# Altium footprint library KF.PcbLib: 43 footprints (part 3 of 3)
Each footprint in its own frame and in the unit in brackets; x right, y up, seen from the top. Pads: shape width x height; smd on the part's side, far side on the other; paste and mask are expansions set on the pad; w line width, h text height; cw(c..) or ccw(c..) is an arc to the next point about the centre after c.
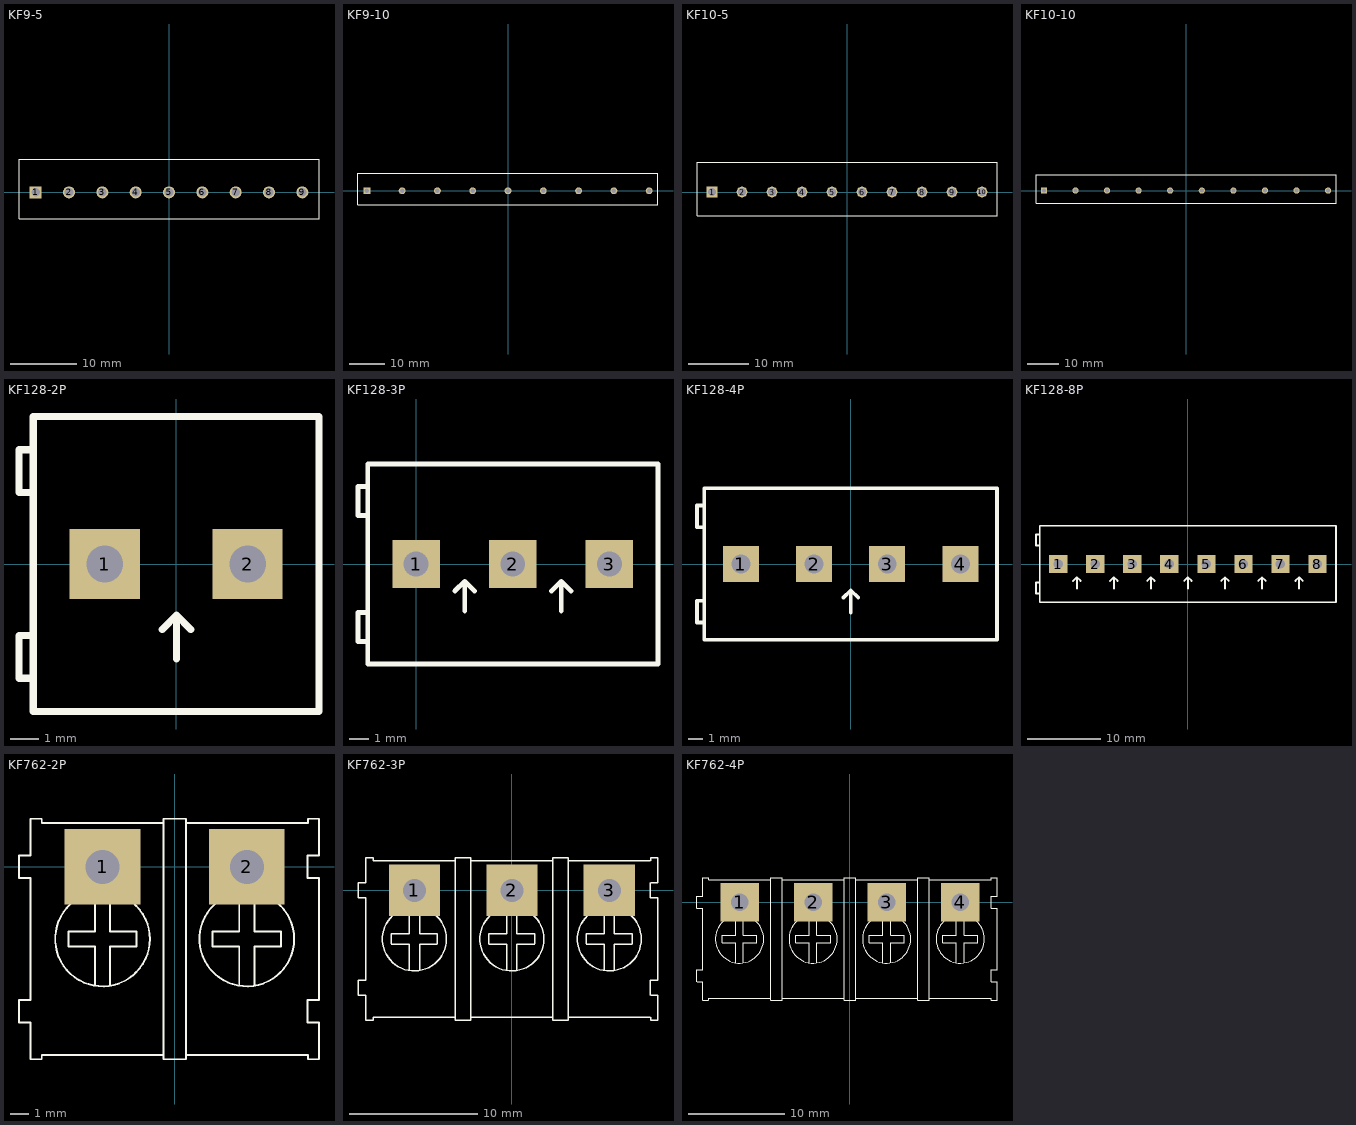
[diagram p2: the footprints below, top view; thin cyan lines are the x and y axes]

## KF9-5 [mm] "Serie 1337 - 5.00 mm_9 pins"
height 13
pads (9):
  rect 1.8x1.8 hole 1.3: 1(-20,0)
  round 1.8 hole 1.3: 2(-15,0) 3(-10,0) 4(-5,0) 5(0,0) 6(5,0) 7(10,0) 8(15,0) 9(20,0)
Top Overlay:
  lines w0.127: -22.5,-4 22.5,-4 22.5,5 -22.5,5 -22.5,-4
3D body "691133710009.stp": height 13, standoff -3.6, extent -22.5,-4 22.5,5

## KF9-10 [mm] "Serie 1368 - 10.00 mm _ 9 pins"
height 13
pads (9):
  rect 1.95x1.95 hole 1.3: 1(-40,0)
  round 1.95 hole 1.3: 2(-30,0) 3(-20,0) 4(-10,0) 5(0,0) 6(10,0) 7(20,0) 8(30,0) 9(40,0)
Top Overlay:
  lines w0.2: -42.5,-4 42.5,-4 42.5,5 -42.5,5 -42.5,-4
3D body "691136810009.stp": height 13.1, standoff -3.9, extent -42.5,-4 42.5,5

## KF10-5 [mm] "Serie 1337 - 5.00 mm_10 pins"
height 13
pads (10):
  rect 1.8x1.8 hole 1.3: 1(-22.5,0)
  round 1.8 hole 1.3: 2(-17.5,0) 3(-12.5,0) 4(-7.5,0) 5(-2.5,0) 6(2.5,0) 7(7.5,0) 8(12.5,0) 9(17.5,0) 10(22.5,0)
Top Overlay:
  lines w0.127: -25,-4 25,-4 25,5 -25,5 -25,-4
3D body "691133710010.stp": height 13, standoff -3.6, extent -25,-4 25,5

## KF10-10 [mm] "Serie 1368 - 10.00 mm _ 10 pins"
height 13
pads (10):
  rect 1.95x1.95 hole 1.3: 1(-45,0)
  round 1.95 hole 1.3: 2(-35,0) 3(-25,0) 4(-15,0) 5(-5,0) 6(5,0) 7(15,0) 8(25,0) 9(35,0) 10(45,0)
Top Overlay:
  lines w0.2: -47.5,-4 -47.5,5 47.5,5 47.5,-4 -47.5,-4
3D body "691136810010.stp": height 13.1, standoff -3.9, extent -47.5,-4 47.5,5

## KF128-2P [mm]
pads (2):
  rect 2.5x2.5 hole 1.3: 1(-2.54,0) 2(2.54,0)
Top Overlay:
  lines w0.254: -0.495,-2.324 0.013,-1.816 ; 0.013,-3.378 0.013,-1.816 ; 0.521,-2.324 0.013,-1.816 ; -5.588,-4.064 -5.08,-4.064 -5.08,-2.54 -5.588,-2.54 -5.588,-4.064 ; -5.588,2.54 -5.08,2.54 -5.08,4.064 -5.588,4.064 -5.588,2.54 ; -5.08,-5.25 5.08,-5.25 5.08,5.25 -5.08,5.25 -5.08,-5.25
3D body "User Library-TER-KF128-2P.step": height 14.35, standoff -4.95, extent -5.68,-5.25 5.08,5.25

## KF128-3P [mm]
pads (3):
  rect 2.5x2.5 hole 1.3: 1(0,0) 2(5.08,0) 3(10.147,0)
Top Overlay:
  lines w0.254: 2.045,-1.41 2.553,-0.902 ; 2.553,-2.464 2.553,-0.902 ; 3.061,-1.41 2.553,-0.902 ; 7.112,-1.41 7.62,-0.902 ; 7.62,-2.464 7.62,-0.902 ; 8.128,-1.41 7.62,-0.902 ; -3.048,-4.064 -2.54,-4.064 -2.54,-2.54 -3.048,-2.54 -3.048,-4.064 ; -3.048,2.54 -3.048,4.064 -2.54,4.064 -2.54,2.54 -3.048,2.54 ; -2.54,-5.25 -2.54,5.25 12.7,5.25 12.7,-5.25 -2.54,-5.25
3D body "User Library-TER-KF128-3P.step": height 14.55, standoff -4.75, extent -3.152,-5.253 12.688,5.247

## KF128-4P [mm]
pads (4):
  rect 2.5x2.5 hole 1.3: 1(-7.62,0) 2(-2.54,0) 3(2.54,0) 4(7.62,0)
Top Overlay:
  lines w0.254: -0.495,-2.324 0.013,-1.816 ; 0.013,-3.378 0.013,-1.816 ; 0.521,-2.324 0.013,-1.816 ; -10.668,-4.064 -10.16,-4.064 -10.16,-2.54 -10.668,-2.54 -10.668,-4.064 ; -10.668,2.54 -10.16,2.54 -10.16,4.064 -10.668,4.064 -10.668,2.54 ; -10.16,-5.25 10.16,-5.25 10.16,5.25 -10.16,5.25 -10.16,-5.25
3D body "User Library-TER-KF128-2P.step": height 14.35, standoff -4.95, extent -10.76,-5.25 0,5.25
3D body "User Library-TER-KF128-2P.step": height 14.35, standoff -4.95, extent -0.6,-5.25 10.16,5.25

## KF128-8P [mm]
pads (8):
  rect 2.5x2.5 hole 1.3: 1(-17.78,0) 2(-12.7,0) 3(-7.62,0) 4(-2.54,0) 5(2.54,0) 6(7.62,0) 7(12.7,0) 8(17.78,0)
Top Overlay:
  lines w0.254: -15.735,-2.324 -15.227,-1.816 ; -15.227,-3.378 -15.227,-1.816 ; -14.719,-2.324 -15.227,-1.816 ; -10.655,-2.324 -10.147,-1.816 ; -10.147,-3.378 -10.147,-1.816 ; -9.639,-2.324 -10.147,-1.816 ; -5.575,-2.324 -5.067,-1.816 ; -5.067,-3.378 -5.067,-1.816 ; -4.559,-2.324 -5.067,-1.816 ; -0.495,-2.324 0.013,-1.816 ; 0.013,-3.378 0.013,-1.816 ; 0.521,-2.324 0.013,-1.816 ; 4.585,-2.324 5.093,-1.816 ; 5.093,-3.378 5.093,-1.816 ; 5.601,-2.324 5.093,-1.816 ; 9.665,-2.324 10.173,-1.816 ; 10.173,-3.378 10.173,-1.816 ; 10.681,-2.324 10.173,-1.816 ; 14.745,-2.324 15.253,-1.816 ; 15.253,-3.378 15.253,-1.816 ; 15.761,-2.324 15.253,-1.816 ; -20.828,-4.064 -20.828,-2.54 -20.32,-2.54 -20.32,-4.064 -20.828,-4.064 ; -20.828,2.54 -20.828,4.064 -20.32,4.064 -20.32,2.54 -20.828,2.54 ; -20.32,-5.25 -20.32,5.25 20.32,5.25 20.32,-5.25 -20.32,-5.25
3D body "User Library-TER-KF128-2P.step": height 14.35, standoff -4.95, extent -10.76,-5.25 0,5.25
3D body "User Library-TER-KF128-2P.step": height 14.35, standoff -4.95, extent -20.92,-5.25 -10.16,5.25
3D body "User Library-TER-KF128-2P.step": height 14.35, standoff -4.95, extent -0.6,-5.25 10.16,5.25
3D body "User Library-TER-KF128-2P.step": height 14.35, standoff -4.95, extent 9.56,-5.25 20.32,5.25

## KF762-2P [mm]
pads (2):
  rect 4x4 hole 1.8: 1(-3.81,0) 2(3.81,0)
Top Overlay:
  circle w0.102: c-3.81,-3.81 r2.5
  circle w0.102: c3.81,-3.81 r2.5
  lines w0.102: -8.22,-8.22 -8.22,-7.02 -7.62,-7.02 -7.62,-0.6 -8.22,-0.6 -8.22,0.6 ; -8.204,-8.22 -7.62,-8.22 -7.62,-10.16 -7.036,-10.16 ; -8.204,0.6 -7.62,0.6 -7.62,2.54 -7.036,2.54 ; -7.02,-10.16 -7.02,-9.931 -0.6,-9.931 -0.6,-10.16 0.6,-10.16 0.6,-9.931 7.02,-9.931 ; -7.02,2.54 -7.02,2.311 -0.6,2.311 -0.6,2.54 0.6,2.54 0.6,2.311 7.02,2.311 ; -5.613,-4.21 -4.21,-4.21 ; -5.613,-4.191 -5.613,-3.404 ; -5.613,-3.41 -4.21,-3.41 ; -4.21,-6.274 -4.21,-4.216 ; -4.21,-3.404 -4.21,-1.346 ; -3.41,-6.274 -3.41,-4.216 ; -3.41,-4.21 -2.007,-4.21 ; -3.41,-3.41 -2.007,-3.41 ; -3.41,-3.404 -3.41,-1.346 ; -2.007,-4.191 -2.007,-3.404 ; -0.6,-10.008 -0.6,2.413 ; 0.6,-10.008 0.6,2.413 ; 2.007,-4.21 3.41,-4.21 ; 2.007,-4.191 2.007,-3.404 ; 2.007,-3.41 3.41,-3.41 ; 3.41,-6.274 3.41,-4.216 ; 3.41,-3.404 3.41,-1.346 ; 4.21,-6.274 4.21,-4.216 ; 4.21,-4.21 5.613,-4.21 ; 4.21,-3.41 5.613,-3.41 ; 4.21,-3.404 4.21,-1.346 ; 5.613,-4.191 5.613,-3.404 ; 7.02,-8.22 7.02,-7.02 7.62,-7.02 7.62,-0.6 7.02,-0.6 7.02,0.6 ; 7.036,-9.931 7.036,-10.16 7.62,-10.16 7.62,-8.22 7.036,-8.22 ; 7.036,0.6 7.62,0.6 7.62,2.54 7.036,2.54 7.036,2.311
3D body "BR-76231C-02.stp": height 10.6, standoff -3.8, extent -7.62,-9.833 7.62,2.667

## KF762-3P [mm]
pads (3):
  rect 4x4 hole 1.8: 1(-7.62,0) 2(0,0) 3(7.62,0)
Top Overlay:
  circle w0.102: c7.62,-3.81 r2.5
  circle w0.102: c0,-3.81 r2.5
  circle w0.102: c-7.62,-3.81 r2.5
  lines w0.102: -12.03,-8.22 -12.03,-7.02 -11.43,-7.02 -11.43,-0.6 -12.03,-0.6 -12.03,0.6 ; -12.014,-8.22 -11.43,-8.22 -11.43,-10.16 -10.846,-10.16 ; -12.014,0.6 -11.43,0.6 -11.43,2.54 -10.846,2.54 ; -10.83,-10.16 -10.83,-9.931 -4.41,-9.931 ; -10.83,2.54 -10.83,2.311 -4.41,2.311 -4.41,2.54 -3.21,2.54 -3.21,2.311 3.21,2.311 3.21,2.54 4.41,2.54 4.41,2.311 10.83,2.311 ; -9.423,-4.21 -8.02,-4.21 ; -9.423,-4.191 -9.423,-3.404 ; -9.423,-3.41 -8.02,-3.41 ; -8.02,-6.274 -8.02,-4.216 ; -8.02,-3.404 -8.02,-1.346 ; -7.22,-6.274 -7.22,-4.216 ; -7.22,-4.21 -5.817,-4.21 ; -7.22,-3.41 -5.817,-3.41 ; -7.22,-3.404 -7.22,-1.346 ; -5.817,-4.191 -5.817,-3.404 ; -4.41,-8.22 -4.41,-7.02 ; -4.41,-0.6 -4.41,0.6 ; -4.41,2.413 -4.41,-10.16 -3.21,-10.16 -3.21,-9.931 3.21,-9.931 3.21,-10.16 4.41,-10.16 4.41,-9.931 10.83,-9.931 ; -4.394,-10.16 -3.81,-10.16 ; -4.394,2.54 -3.81,2.54 ; -3.21,-10.008 -3.21,2.413 ; -1.803,-4.21 -0.4,-4.21 ; -1.803,-4.191 -1.803,-3.404 ; -1.803,-3.41 -0.4,-3.41 ; -0.4,-6.274 -0.4,-4.216 ; -0.4,-3.404 -0.4,-1.346 ; 0.4,-6.274 0.4,-4.216 ; 0.4,-4.21 1.803,-4.21 ; 0.4,-3.41 1.803,-3.41 ; 0.4,-3.404 0.4,-1.346 ; 1.803,-4.191 1.803,-3.404 ; 3.21,-10.008 3.21,2.413 ; 4.41,-10.008 4.41,2.413 ; 5.817,-4.21 7.22,-4.21 ; 5.817,-4.191 5.817,-3.404 ; 5.817,-3.41 7.22,-3.41 ; 7.22,-6.274 7.22,-4.216 ; 7.22,-3.404 7.22,-1.346 ; 8.02,-6.274 8.02,-4.216 ; 8.02,-4.21 9.423,-4.21 ; 8.02,-3.41 9.423,-3.41 ; 8.02,-3.404 8.02,-1.346 ; 9.423,-4.191 9.423,-3.404 ; 10.83,-8.22 10.83,-7.02 11.43,-7.02 11.43,-0.6 10.83,-0.6 10.83,0.6 ; 10.846,-9.931 10.846,-10.16 11.43,-10.16 11.43,-8.22 10.846,-8.22 ; 10.846,0.6 11.43,0.6 11.43,2.54 10.846,2.54 10.846,2.311 ; 3.21,-8.22 3.21,-7.02 3.21,-8.22 ; 3.21,-0.6 3.21,0.6 3.21,-0.6 ; 3.226,-10.16 3.81,-10.16 3.226,-10.16 ; 3.226,2.54 3.81,2.54 3.226,2.54
3D body "BR-76231C-03.stp": height 10.4, standoff -4, extent -11.43,-9.833 11.43,2.667

## KF762-4P [mm]
pads (4):
  rect 4x4 hole 1.8: 1(-11.43,0) 2(-3.81,0) 3(3.81,0) 4(11.43,0)
Top Overlay:
  circle w0.102: c-3.81,-3.81 r2.5
  circle w0.102: c-11.43,-3.81 r2.5
  circle w0.102: c3.81,-3.81 r2.5
  circle w0.102: c11.43,-3.81 r2.5
  lines w0.102: -15.84,-8.22 -15.84,-7.02 -15.24,-7.02 -15.24,-0.6 -15.84,-0.6 -15.84,0.6 ; -15.824,-8.22 -15.24,-8.22 -15.24,-10.16 -14.656,-10.16 ; -15.824,0.6 -15.24,0.6 -15.24,2.54 -14.656,2.54 ; -14.64,-10.16 -14.64,-9.931 -8.22,-9.931 -8.22,-10.16 -7.02,-10.16 -7.02,-9.931 -0.6,-9.931 -0.6,-10.16 0.6,-10.16 0.6,-9.931 7.02,-9.931 7.02,-10.16 8.22,-10.16 8.22,-9.931 14.64,-9.931 ; -14.64,2.54 -14.64,2.311 -8.22,2.311 -8.22,2.54 -7.02,2.54 -7.02,2.311 -0.6,2.311 -0.6,2.54 0.6,2.54 0.6,2.311 7.02,2.311 7.02,2.54 8.22,2.54 8.22,2.311 14.64,2.311 ; -13.233,-4.21 -11.83,-4.21 ; -13.233,-4.191 -13.233,-3.404 ; -13.233,-3.41 -11.83,-3.41 ; -11.83,-6.274 -11.83,-4.216 ; -11.83,-3.404 -11.83,-1.346 ; -11.03,-6.274 -11.03,-4.216 ; -11.03,-4.21 -9.627,-4.21 ; -11.03,-3.41 -9.627,-3.41 ; -11.03,-3.404 -11.03,-1.346 ; -9.627,-4.191 -9.627,-3.404 ; -8.22,-10.008 -8.22,2.413 ; -7.02,-10.008 -7.02,2.413 ; -5.613,-4.21 -4.21,-4.21 ; -5.613,-4.191 -5.613,-3.404 ; -5.613,-3.41 -4.21,-3.41 ; -4.21,-6.274 -4.21,-4.216 ; -4.21,-3.404 -4.21,-1.346 ; -3.41,-6.274 -3.41,-4.216 ; -3.41,-4.21 -2.007,-4.21 ; -3.41,-3.41 -2.007,-3.41 ; -3.41,-3.404 -3.41,-1.346 ; -2.007,-4.191 -2.007,-3.404 ; -0.6,-10.008 -0.6,2.413 ; -0.6,-8.22 -0.6,-7.02 ; -0.6,-0.6 -0.6,0.6 ; -0.584,-9.931 -0.584,-10.16 0,-10.16 ; -0.584,2.311 -0.584,2.54 0,2.54 ; 0.6,-10.008 0.6,2.413 ; 2.007,-4.21 3.41,-4.21 ; 2.007,-4.191 2.007,-3.404 ; 2.007,-3.41 3.41,-3.41 ; 3.41,-6.274 3.41,-4.216 ; 3.41,-3.404 3.41,-1.346 ; 4.21,-6.274 4.21,-4.216 ; 4.21,-4.21 5.613,-4.21 ; 4.21,-3.41 5.613,-3.41 ; 4.21,-3.404 4.21,-1.346 ; 5.613,-4.191 5.613,-3.404 ; 7.02,-10.008 7.02,2.413 ; 8.22,-10.008 8.22,2.413 ; 9.627,-4.21 11.03,-4.21 ; 9.627,-4.191 9.627,-3.404 ; 9.627,-3.41 11.03,-3.41 ; 11.03,-6.274 11.03,-4.216 ; 11.03,-3.404 11.03,-1.346 ; 11.83,-6.274 11.83,-4.216 ; 11.83,-4.21 13.233,-4.21 ; 11.83,-3.41 13.233,-3.41 ; 11.83,-3.404 11.83,-1.346 ; 13.233,-4.191 13.233,-3.404 ; 14.64,-8.22 14.64,-7.02 15.24,-7.02 15.24,-0.6 14.64,-0.6 14.64,0.6 ; 14.656,-9.931 14.656,-10.16 15.24,-10.16 15.24,-8.22 14.656,-8.22 ; 14.656,0.6 15.24,0.6 15.24,2.54 14.656,2.54 14.656,2.311 ; 7.036,-10.16 7.036,-9.931 7.036,-10.16 ; 7.036,-10.16 7.62,-10.16 7.036,-10.16 ; 7.036,2.54 7.62,2.54 7.036,2.54 ; 7.036,2.54 7.036,2.311 7.036,2.54 ; 7.02,-8.22 7.02,-7.02 7.02,-8.22 ; 7.02,-0.6 7.02,0.6 7.02,-0.6
3D body "BR-76231C-04.stp": height 10.6, standoff -3.8, extent -15.24,-9.833 15.24,2.667